# Altium footprint library Atlan.PcbLib: 283 footprints (part 18 of 18)
Each footprint in its own frame and in the unit in brackets; x right, y up, seen from the top. Pads: shape width x height; smd on the part's side, far side on the other; paste and mask are expansions set on the pad; w line width, h text height; cw(c..) or ccw(c..) is an arc to the next point about the centre after c.
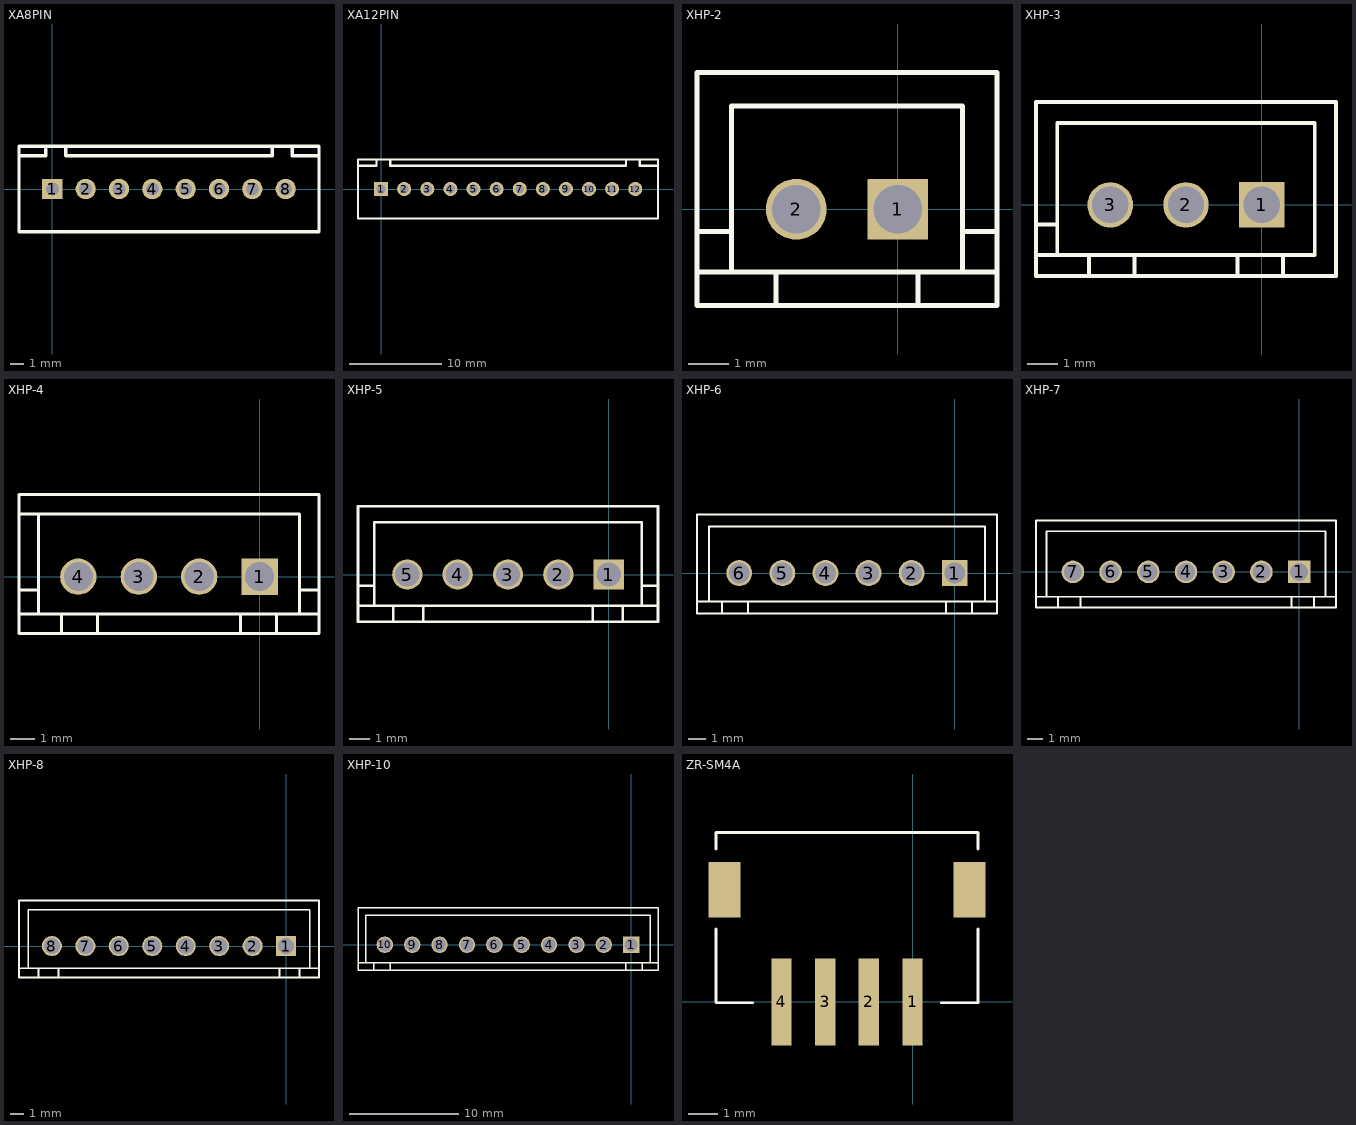
[diagram p17: the footprints below, top view; thin cyan lines are the x and y axes]

## XA8PIN [mil]
pads (8):
  rect 60x60 hole 38: 1(0,0)
  round 60 hole 38: 2(98.43,0) 3(196.85,0) 4(295.28,0) 5(393.7,0) 6(492.13,0) 7(590.55,0) 8(688.98,0)
Top Overlay:
  lines w10: -98.43,98.43 -19.68,98.43 -19.68,118.11 ; 39.37,125.98 39.37,98.43 649.61,98.43 649.61,125.98 ; 708.66,125.98 708.66,98.43 787.4,98.43 ; -98.43,-125.98 787.4,-125.98 787.4,125.98 -98.43,125.98 -98.43,-125.98

## XA12PIN [mil]
pads (12):
  rect 60x60 hole 38: 1(0,0)
  round 60 hole 38: 2(98.43,0) 3(196.85,0) 4(295.28,0) 5(393.7,0) 6(492.13,0) 7(590.55,0) 8(688.98,0) 9(787.4,0) 10(885.83,0) 11(984.25,0) 12(1082.68,0)
Top Overlay:
  lines w10: -98.43,98.43 -19.68,98.43 -19.68,125.98 ; 39.37,118.11 39.37,98.43 1043.31,98.43 1043.31,125.98 ; 1102.36,125.98 1102.36,98.43 1179.53,98.43 ; 1179.5,-125.98 -98.43,-125.98 -98.43,125.98 1179.5,125.98 ; 1179.53,-125.98 1179.53,125.98

## XHP-2 [mm]
pads (2):
  rect 1.5x1.5 hole 1.2: 1(0,0)
  round 1.5 hole 1.2: 2(-2.5,0)
Top Overlay:
  lines w0.127: -4.95,-1.55 -4.1,-1.55 ; -4.95,-0.55 -4.1,-0.55 ; -3,-2.375 -3,-1.55 ; 0.5,-2.375 0.5,-1.55 ; 1.6,-0.55 2.45,-0.55 ; 2.45,-1.55 1.6,-1.55 ; -4.1,-1.55 -4.1,2.55 1.6,2.55 1.6,-1.55 ; -4.1,-1.55 1.6,-1.55 ; -4.95,-2.375 -4.95,3.375 2.45,3.375 2.45,-2.375 -4.95,-2.375
3D body "User Library-JST B2B-XH-A.STEP": height 7, standoff -3.4, extent -4.95,-2.375 2.45,3.375

## XHP-3 [mm]
pads (3):
  rect 1.5x1.5 hole 1.2: 1(0,0)
  round 1.5 hole 1.2: 2(-2.5,0) 3(-5,0)
Top Overlay:
  lines w0.127: -7.45,-1.65 -6.75,-1.65 ; -7.45,-0.65 -6.75,-0.65 ; -5.7,-2.35 -5.7,-1.65 ; -4.2,-2.35 -4.2,-1.65 ; -0.8,-2.35 -0.8,-1.65 ; 0.7,-2.35 0.7,-1.65 ; -6.75,-1.65 -6.75,2.7 1.75,2.7 1.75,-1.65 -6.75,-1.65 ; -7.45,-2.35 -7.45,3.4 2.45,3.4 2.45,-2.35 -7.45,-2.35
3D body "SW3dPS-jst-b3b-xh-a.STEP": height 7, standoff -3.4, extent -7.45,-2.35 2.45,3.4

## XHP-4 [mm]
pads (4):
  rect 1.5x1.5 hole 1.2: 1(0,0)
  round 1.5 hole 1.2: 2(-2.5,0) 3(-5,0) 4(-7.5,0)
Top Overlay:
  lines w0.127: -9.95,-0.55 -9.15,-0.55 ; -9.95,2.6 1.65,2.6 1.65,-1.55 ; -9.15,2.6 -9.15,-1.55 -9.95,-1.55 1.65,-1.55 ; -8.2,-2.35 -8.2,-1.55 ; -6.7,-2.35 -6.7,-1.55 ; -0.8,-2.35 -0.8,-1.55 ; 0.7,-2.35 0.7,-1.55 ; 1.65,-0.55 2.45,-0.55 ; 2.45,-1.55 1.65,-1.55 ; -9.95,-2.35 -9.95,3.4 2.45,3.4 2.45,-2.35 -9.95,-2.35
3D body "jstb4bxha.STEP": height 7.02, standoff -3.38, extent -9.95,-2.35 2.45,3.4

## XHP-5 [mm]
pads (5):
  rect 1.5x1.5 hole 1.2: 1(0,0)
  round 1.5 hole 1.2: 2(-2.5,0) 3(-5,0) 4(-7.5,0) 5(-10,0)
Top Overlay:
  lines w0.127: -12.45,-1.55 -11.65,-1.55 ; -12.45,-0.55 -11.65,-0.55 ; -10.7,-2.35 -10.7,-1.55 ; -9.2,-2.35 -9.2,-1.55 ; -0.8,-2.35 -0.8,-1.55 ; 0.7,-2.35 0.7,-1.55 ; 1.65,-0.55 2.45,-0.55 ; 2.45,-1.55 1.65,-1.55 ; -11.65,-1.55 1.65,-1.55 ; -11.65,-1.55 -11.65,2.6 1.65,2.6 1.65,-1.55 ; -12.45,-2.35 2.45,-2.35 2.45,3.4 -12.45,3.4 -12.45,-2.35
3D body "SW3dPS-jst-b5b-xh-a.STEP": height 7, standoff -3.4, extent -12.45,-2.35 2.45,3.4

## XHP-6 [mm]
pads (6):
  rect 1.5x1.5 hole 1.2: 1(0,0)
  round 1.5 hole 1.2: 2(-2.5,0) 3(-5,0) 4(-7.5,0) 5(-10,0) 6(-12.5,0)
Top Overlay:
  lines w0.127: -14.9,-1.65 -14.25,-1.65 ; -13.5,-2.35 -13.5,-1.65 ; -12,-2.35 -12,-1.65 ; -0.5,-2.35 -0.5,-1.65 ; 1,-2.35 1,-1.65 ; 2.4,-1.65 1.75,-1.65 ; -14.25,-1.65 1.75,-1.65 ; -14.25,-1.65 -14.25,2.7 1.75,2.7 1.75,-1.65 ; -14.95,-2.35 2.45,-2.35 2.45,3.4 -14.95,3.4 -14.95,-2.35
3D body "SW3dPS-jst-b6b-xh-a.STEP": height 7, standoff -3.4, extent -14.95,-2.35 2.45,3.4

## XHP-7 [mm]
pads (7):
  rect 1.5x1.5 hole 1.2: 1(0,0)
  round 1.5 hole 1.2: 2(-2.5,0) 3(-5,0) 4(-7.5,0) 5(-10,0) 6(-12.5,0) 7(-15,0)
Top Overlay:
  lines w0.127: -17.4,-1.65 -16.75,-1.65 ; -16,-2.35 -16,-1.65 ; -14.5,-2.35 -14.5,-1.65 ; -0.5,-2.35 -0.5,-1.65 ; 1,-2.35 1,-1.65 ; 2.4,-1.65 1.75,-1.65 ; -16.75,-1.65 -16.75,2.7 1.75,2.7 1.75,-1.65 ; -16.75,-1.65 1.75,-1.65 ; -17.45,-2.35 -17.45,3.4 2.45,3.4 2.45,-2.35 -17.45,-2.35
3D body "JSTB7BXHA.STEP": height 7.02, standoff -3.38, extent -17.45,-2.35 2.45,3.4

## XHP-8 [mm]
pads (8):
  rect 1.5x1.5 hole 1.2: 1(0,0)
  round 1.5 hole 1.2: 2(-2.5,0) 3(-5,0) 4(-7.5,0) 5(-10,0) 6(-12.5,0) 7(-15,0) 8(-17.5,0)
Top Overlay:
  lines w0.127: -19.9,-1.65 -19.25,-1.65 ; -18.5,-2.35 -18.5,-1.65 ; -17,-2.35 -17,-1.65 ; -0.5,-2.35 -0.5,-1.65 ; 1,-2.35 1,-1.65 ; 2.4,-1.65 1.75,-1.65 ; -19.25,-1.65 -19.25,2.7 1.75,2.7 1.75,-1.65 ; -19.25,-1.65 1.75,-1.65 ; -19.95,-2.35 -19.95,3.4 2.45,3.4 2.45,-2.35 -19.95,-2.35
3D body "JSTB8BXHA.STEP": height 6.96, standoff -3.44, extent -19.967,-2.35 2.45,3.4

## XHP-10 [mm]
pads (10):
  rect 1.5x1.5 hole 1.2: 1(0,0)
  round 1.5 hole 1.2: 2(-2.5,0) 3(-5,0) 4(-7.5,0) 5(-10,0) 6(-12.5,0) 7(-15,0) 8(-17.5,0) 9(-20,0) 10(-22.5,0)
Top Overlay:
  lines w0.127: -24.9,-1.65 -24.25,-1.65 ; -23.5,-2.35 -23.5,-1.65 ; -22,-2.35 -22,-1.65 ; -0.5,-2.35 -0.5,-1.65 ; 1,-2.35 1,-1.65 ; 2.4,-1.65 1.75,-1.65 ; -24.25,-1.65 1.75,-1.65 ; -24.25,-1.65 -24.25,2.7 1.75,2.7 1.75,-1.65 ; -24.95,-2.35 2.45,-2.35 2.45,3.4 -24.95,3.4 -24.95,-2.35
3D body "JSTB10BXHA.STEP": height 7.02, standoff -3.38, extent -24.95,-2.35 2.45,3.4

## ZR-SM4A [mm]
pads (6):
  rect 0.7x3 smd: 1(0,0) 2(-1.5,0) 3(-3,0) 4(-4.5,0)
  rect 1.1x1.9 smd: ""(-6.45,3.85) ""(1.95,3.85)
Top Overlay:
  lines w0.1: -6.75,2.5 -6.75,0 -6.725,-0.025 -5.5,-0.025 ; -6.75,5.25 -6.75,5.825 2.25,5.825 2.25,5.25 ; 1,-0.025 2.25,-0.025 2.25,2.5